# Altium integrated library ICL_komponenty_v1.IntLib: 293 symbols (part 2 of 2)
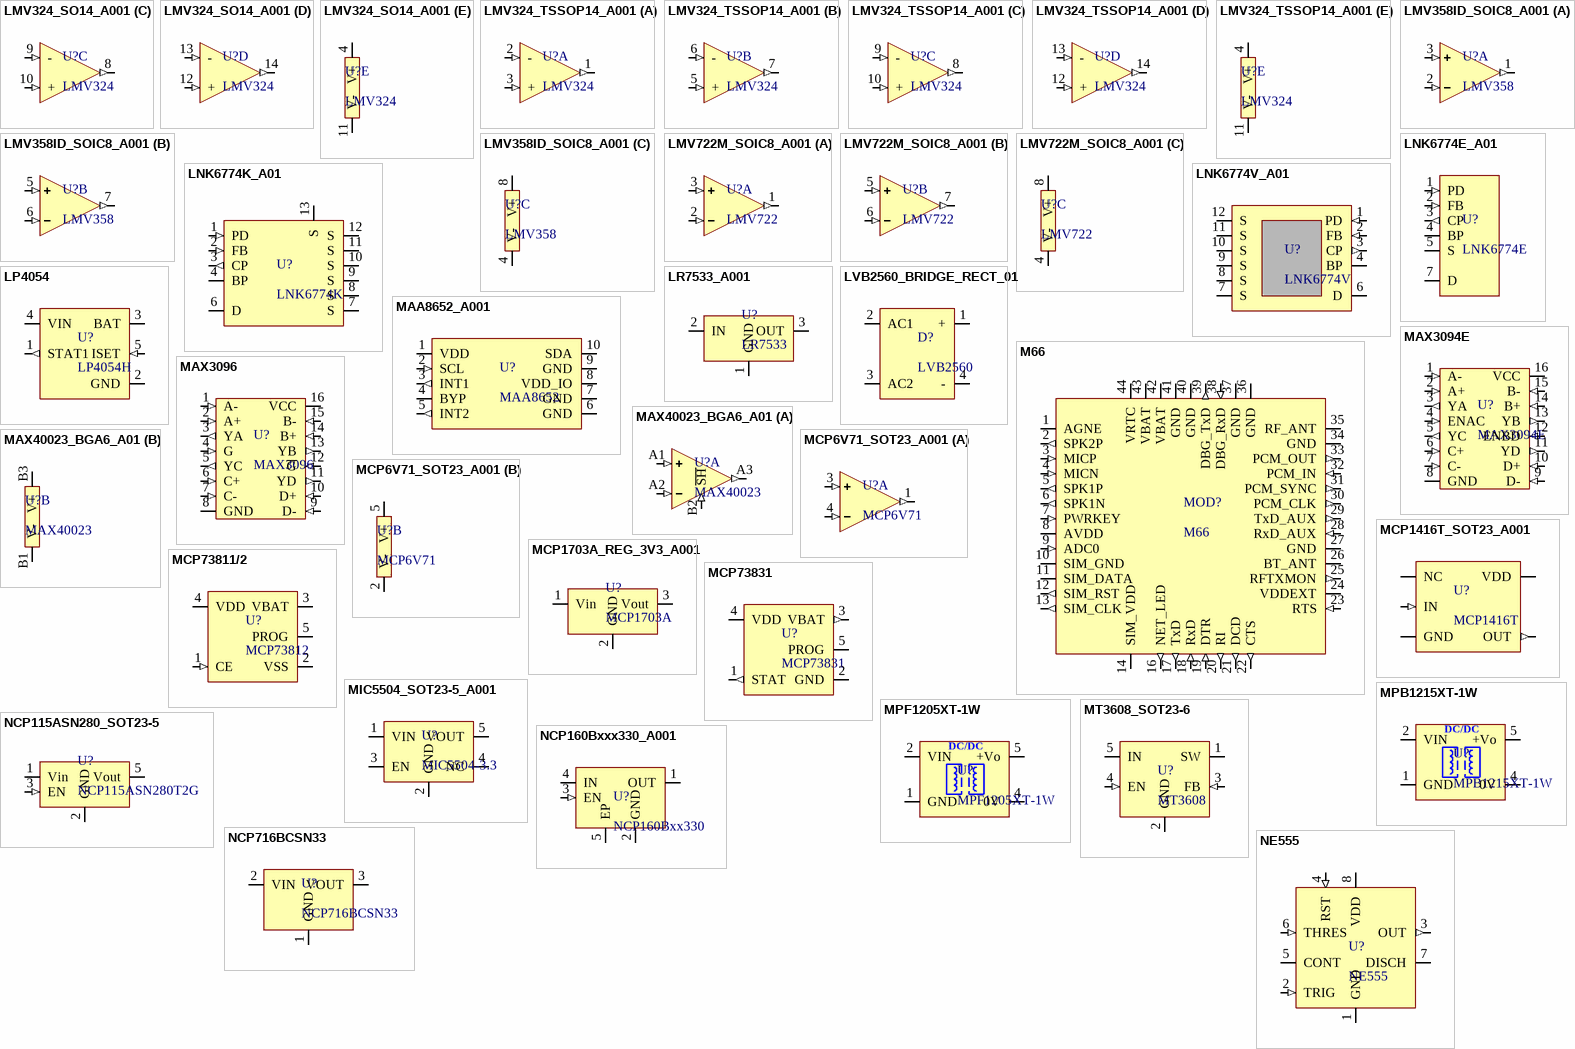
[diagram p12: symbols LMV324_SO14_A001 to NE555]

## LMV324_SO14_A001
designator U?, comment LMV324
4 x OpAmp R/R 1MHz; ICLN: IC_LMV324_SO14_A001
footprint SO-14
part A pins: 1 OUT (out), 2 - (in), 3 + (in)
part B pins: 5 + (in), 6 - (in), 7 OUT (out)
part C pins: 8 OUT (out), 9 - (in), 10 + (in)
part D pins: 12 + (in), 13 - (in), 14 OUT (out)
part E pins: 4 V+ (power), 11 V-

## LMV324_TSSOP14_A001
designator U?, comment LMV324
4 x OpAmp R/R 1MHz; ICLN: IC_LMV324_TSSOP14_A001
footprint TSSOP-14
part A pins: 1 OUT (out), 2 - (in), 3 + (in)
part B pins: 5 + (in), 6 - (in), 7 OUT (out)
part C pins: 8 OUT (out), 9 - (in), 10 + (in)
part D pins: 12 + (in), 13 - (in), 14 OUT (out)
part E pins: 4 V+ (power), 11 V-

## LMV358ID_SOIC8_A001
designator U?, comment LMV358
Low cost, low power, input/output rail-to-rail operational / amplifiers; ICLN: IC_LMV358ID_SOIC8_A001
footprint SO-8
part A pins: 1 1OUT (out), 2 1IN- (in), 3 1IN+ (in)
part B pins: 5 1IN+ (in), 6 1IN- (in), 7 1OUT (out)
part C pins: 4 V-, 8 V+ (power)

## LMV722M_SOIC8_A001
designator U?, comment LMV722
Low cost, low power, input/output rail-to-rail operational / amplifiers; ICLN: IC_LMV722N_SOIC8_A001
footprint SO-8
part A pins: 1 1OUT (out), 2 1IN- (in), 3 1IN+ (in)
part B pins: 5 1IN+ (in), 6 1IN- (in), 7 1OUT (out)
part C pins: 4 V-, 8 V+ (power)

## LNK6774E_A01
designator U?, comment LNK6774E
ICLN: IC_LNK6773E_eSOP_A001
footprint eSIP-7C
pins: 1 PD (in), 2 FB (in), 3 CP (out), 4 BP, 5 S, 7 D

## LNK6774K_A01
designator U?, comment LNK6774K
ICLN: IC_LNK6773K_eSOP_A001
footprint eSOP-12B
pins: 1 PD (in), 2 FB (in), 3 CP (out), 4 BP, 6 D, 7 S, 8 S, 9 S, 10 S, 11 S, 12 S, 13 S

## LNK6774V_A01
designator U?, comment LNK6774V
ICLN: IC_LNK6773V_eDIP_A001
footprint eDIP-12B
pins: 1 PD (in), 2 FB (in), 3 CP (out), 4 BP, 6 D, 7 S, 8 S, 9 S, 10 S, 11 S, 12 S

## LP4054
designator U?, comment LP4054H
Standalone Linear Li-Ion Battery Charger 500mA; ICLN: IC_LP4054H_SOT23-5_A001
footprint SOT-23-5
pins: 1 STAT1 (out), 2 GND, 3 BAT (power), 4 VIN (power), 5 ISET (in)

## LR7533_A001
designator U?, comment LR7533
3V3 LDO low IQ
footprint SOT89-3
pins: 1 GND, 2 IN, 3 OUT

## LVB2560_BRIDGE_RECT_01
designator D?, comment LVB2560
Bridge rect. 25A  600V; ICLN: D_DR_25A_600V_THT_GSIB-5S_A001
footprint GSIB-5S-45 (dridge rectifier 45 degry)
pins: 1 +, 2 AC1, 3 AC2, 4 -

## M66
designator MOD?
Quectel M66; ITSN: MOD_GSM_M66_A001
footprint M66
pins: 1 AGNE (power), 2 SPK2P (out), 3 MICP (in), 4 MICN (in), 5 SPK1P (out), 6 SPK1N (out), 7 PWRKEY (in), 8 AVDD (power), 9 ADC0 (in), 10 SIM_GND (power), 11 SIM_DATA (io), 12 SIM_RST (out), 13 SIM_CLK (out), 14 SIM_VDD (power), 16 NET_LED (out), 17 TxD (out), 18 RxD (in), 19 DTR (in), 20 RI (out), 21 DCD (out), 22 CTS (out), 23 RTS (in), 24 VDDEXT (power), 25 RFTXMON (out), 26 BT_ANT, 27 GND (power), 28 RxD_AUX (in), 29 TxD_AUX (out), 30 PCM_CLK (out), 31 PCM_SYNC (out), 32 PCM_IN (in), 33 PCM_OUT (out), 34 GND (power), 35 RF_ANT, 36 GND (power), 37 GND (power), 38 DBG_RxD (in), 39 DBG_TxD (out), 40 GND (power), 41 GND (power), 42 VBAT (power), 43 VBAT (power), 44 VRTC (power)

## MAA8652_A001
designator U?, comment MAA8652
ITSN: IC_KX003_LGA12_A001
footprint DFN-10_ACC (PQFN, 10-Leads, Body 2,00x2,00mm, Pitch 0,40mm, Thermal Pad 0,50x0,50mm, IPC Medium Density)
pins: 1 VDD (power), 2 SCL (in), 3 INT1 (out), 4 BYP, 5 INT2 (out), 6 GND (power), 7 GND (power), 8 VDD_IO (power), 9 GND (power), 10 SDA (io)

## MAX3094E
designator U?
RS422 3v3 SUPPLY
footprint SO-16 (SOIC, 16-Leads, Body 10,0x4,0mm (max), Pitch 1,27mm, IPC Low Density)
pins: 1 A- (in), 2 A+ (in), 3 YA (out), 4 ENAC (in), 5 YC (out), 6 C+ (in), 7 C- (in), 8 GND (power), 9 D- (in), 10 D+ (in), 11 YD (out), 12 ENBD (in), 13 YB (out), 14 B+ (in), 15 B- (in), 16 VCC (power)

## MAX3096
designator U?
RS422 3V3 SUPPLY; ICLN: IC_MAX3096_SO16_A001
footprint SO-16 (SOIC, 16-Leads, Body 10,0x4,0mm (max), Pitch 1,27mm, IPC Low Density)
pins: 1 A- (in), 2 A+ (in), 3 YA (out), 4 G (in), 5 YC (out), 6 C+ (in), 7 C- (in), 8 GND (power), 9 D- (in), 10 D+ (in), 11 YD (out), 12 ~{G} (in), 13 YB (out), 14 B+ (in), 15 B- (in), 16 VCC (power)

## MAX40023_BGA6_A01
designator U?, comment MAX40023
Low-Noise, Low-Power, Low-Bias-Current Amplifiers; ICLN: IC_MAX40023_BGA6_A01
footprint BGA-6_MAXIM
part A pins: A1 1IN+ (in), A2 1IN- (in), A3 1OUT (out), B2 ~{SH} (in)
part B pins: B1 V-, B3 V+ (power)

## MCP6V71_SOT23_A001
designator U?, comment MCP6V71
2 MHz Zero-Drift Op Amps,  Rail-to-Rail Input/Output; ICLN: IC_MCP6V71_SOT23_A001
footprint SOT-23-5
part A pins: 1 1OUT (out), 3 1IN+ (in), 4 1IN- (in)
part B pins: 2 V-, 5 V+ (power)

## MCP1416T_SOT23_A001
designator U?, comment MCP1416T
High speed power MOSFET driver; ITSN: IC_MCP1416_SOT23_A001
footprint SOT-23-5
pins: 1 NC, 2 VDD (power), 3 IN (in), 4 GND (power), 5 OUT (out)

## MCP1703A_REG_3V3_A001
designator U?, comment MCP1703A
LDO Vdrop<600mV, SOT-223, 500mA, Iq = 2uA; ITSN: IC_SPX3819_SOT23-5_A001
footprint SOT-223
pins: 1 Vin, 2 GND, 3 Vout

## MCP73811/2
designator U?, comment MCP73812
single cell Li-Ion Li-Poly linear baterry charger; ITSN: IC_MCP73812_SOT23-5_A001
footprint SOT-23-5
pins: 1 CE (in), 2 VSS (power), 3 VBAT, 4 VDD (power), 5 PROG

## MCP73831
designator U?
500 mA Li-Ion Battery Charge; ITSN: IC_MCP73831_SOT23-5_A001
footprint SOT-23-5
pins: 1 STAT (out), 2 GND (power), 3 VBAT (out), 4 VDD (power), 5 PROG

## MIC5504_SOT23-5_A001
designator U?, comment MIC5504-3.3
Multi komponent 2.2-3.3 V 100mA Iq<65uA; ITSN: IC_LIN_REG_MULTI_SOT23-5_A001
footprint SOT-23-5
pins: 1 VIN (power), 2 GND (power), 3 EN (power), 4 NC, 5 VOUT (power)

## MPB1215XT-1W
designator U?
Isolated DCDC 12V-15V; ICLN: DCDC_MPB1215XT-1W_A001
footprint MPFxxxxXT-1W (MPF MPB isolated DC-DC converter)
pins: 1 GND (power), 2 VIN (power), 4 0V (power), 5 +Vo (power)
text: DC/DC

## MPF1205XT-1W
designator U?
Isolated DCDC 12V-5V; ICLN: DCDC_MPF1205XT-1W_A001
footprint MPFxxxxXT-1W (MPF MPB isolated DC-DC converter)
pins: 1 GND (power), 2 VIN (power), 4 0V (power), 5 +Vo (power)
text: DC/DC

## MT3608_SOT23-6
designator U?, comment MT3608
Boost MT3608; ICLN: IC_MT3608_SOT23-6_A001
footprint SOT23-6 (Zetex)
pins: 1 SW, 2 GND, 3 FB (in), 4 EN (in), 5 IN

## NCP115ASN280_SOT23-5
designator U?, comment NCP115ASN280T2G
2V8 LDO; ICLN: IC_NCP115ASN280T2G_SOT32-5_A001
footprint SOT-23-5
pins: 1 Vin, 2 GND, 3 EN (in), 5 Vout

## NCP160Bxxx330_A001
designator U?, comment NCP160Bxx330
Low drop low noise LDO 3V3; ICLN: IC_NCP160BFCS330_A001
footprint XDFN4
pins: 1 OUT (power), 2 GND, 3 EN (in), 4 IN (power), 5 EP

## NCP716BCSN33
designator U?
ICLN: IC_NCP716BCSN33_SOT23-5_A001
footprint SOT-23-5
pins: 1 GND (power), 2 VIN (power), 3 VOUT (power)

## NE555
designator U?
ITSN: IC_NE555_SO8_A001
footprint SO-8
pins: 1 GND (power), 2 TRIG (in), 3 OUT (out), 4 RST (in), 5 CONT, 6 THRES (in), 7 DISCH (oc), 8 VDD (power)

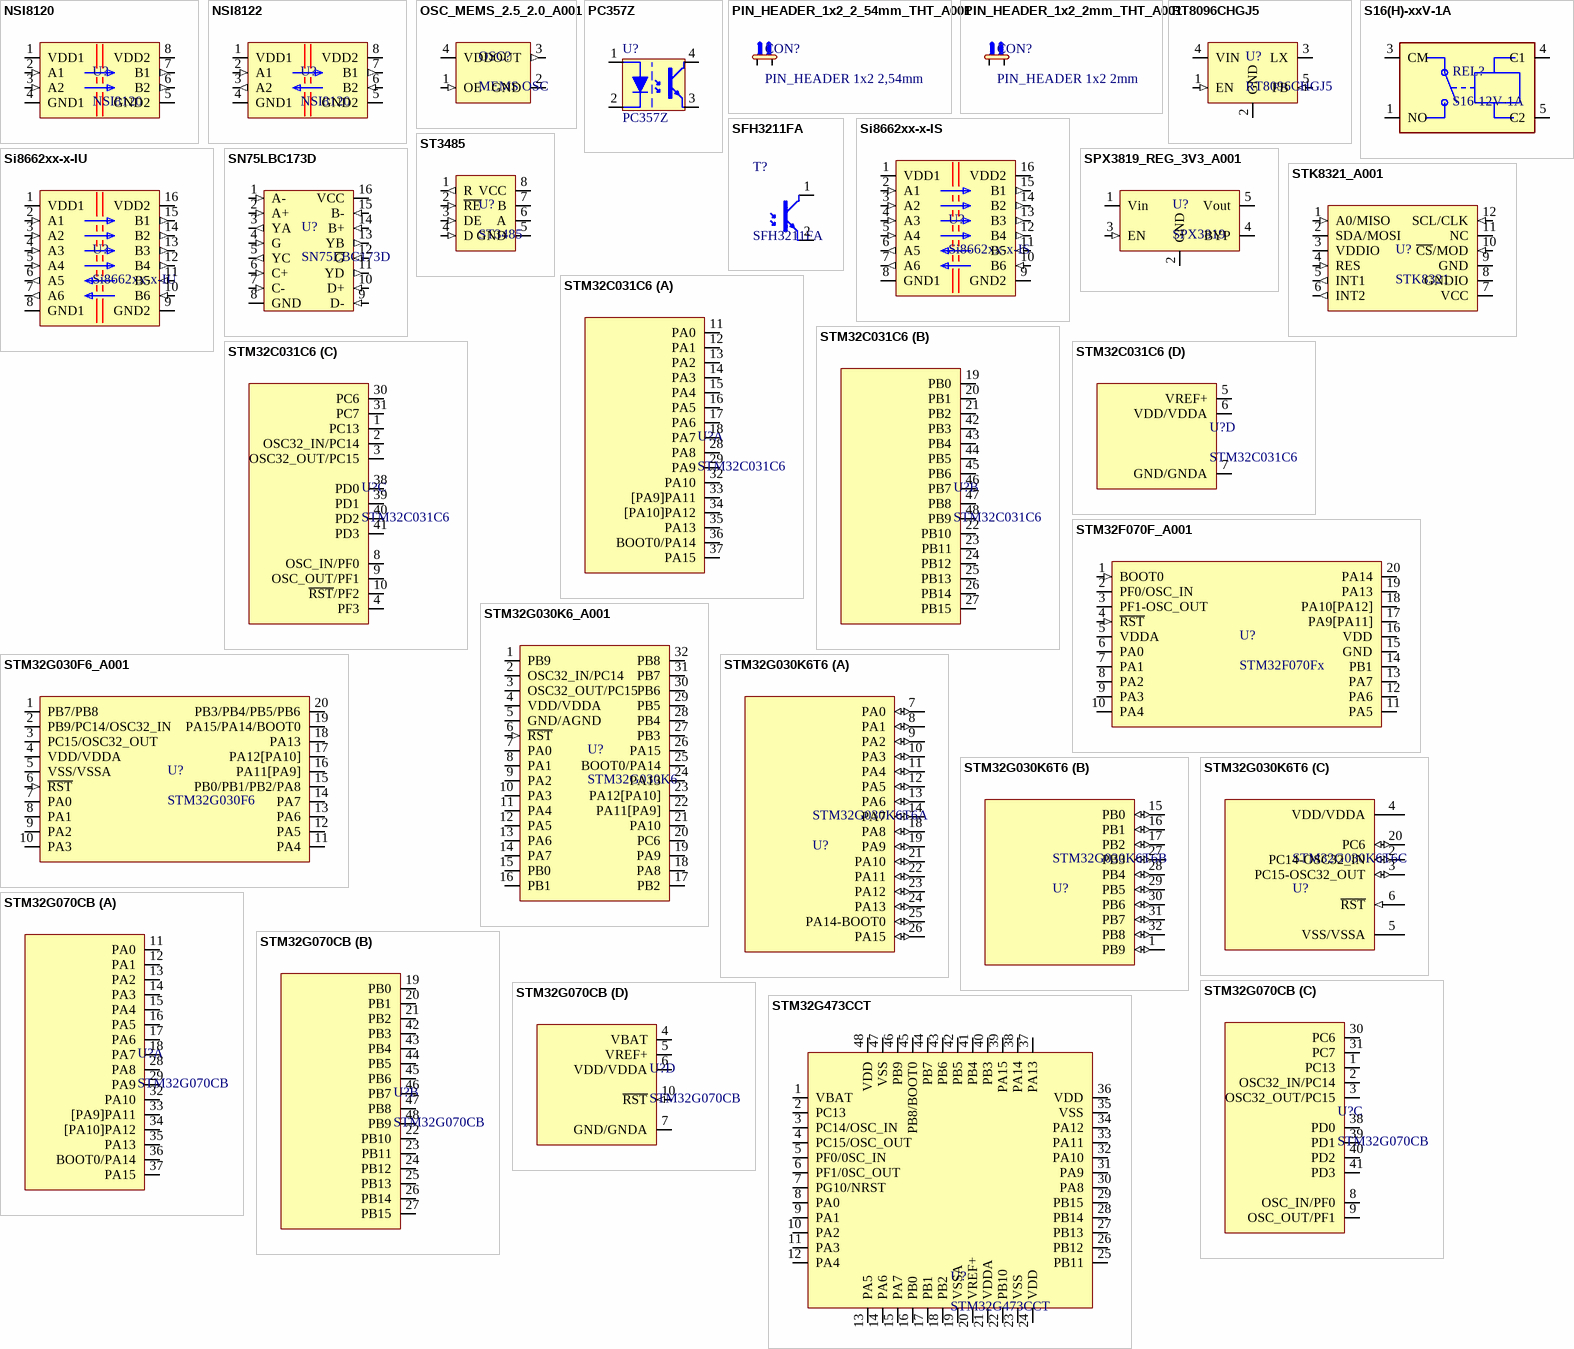
[diagram p8: symbols NSI8120 to STM32G473CCT]

## NSI8120
designator U?
2 channel iso; ICLN: IC_NSI8120_SO-8_A001
footprint SO-8
pins: 1 VDD1 (power), 2 A1 (in), 3 A2 (in), 4 GND1 (power), 5 GND2 (power), 6 B2 (out), 7 B1 (out), 8 VDD2 (power)

## NSI8122
designator U?, comment NSI8120
2 channel iso; ICLN: IC_NSI8122_SO-8_A001
footprint SO-8
pins: 1 VDD1 (power), 2 A1 (in), 3 A2 (out), 4 GND1 (power), 5 GND2 (power), 6 B2 (in), 7 B1 (out), 8 VDD2 (power)

## OSC_MEMS_2.5_2.0_A001
designator OSC?, comment MEMS OSC
ITSN: MEMS_OSC_8MHZ_A001
footprint MEMS_OSC_2.5_3-2_2.5_v1 (mems oscilator 2.5x2 or 3.2x2.5)
pins: 1 OE (in), 2 GND (power), 3 OUT (out), 4 VDD (power)

## PC357Z
designator U?
ITSN: OCT_PC357_SMD_A001
footprint Mini-Flat_4
pins: 1 A, 2 K, 3 E, 4 C

## PIN_HEADER_1x2_2_54mm_THT_A001
designator CON?, comment PIN_HEADER 1x2 2,54mm
footprint PIN_HEADER_1x2_2.54_THT_A001
pins: 1, 2

## PIN_HEADER_1x2_2mm_THT_A001
designator CON?, comment PIN_HEADER 1x2 2mm
footprint PIN_HEADER_1x2_2_THT_A001
pins: 1, 2

## RT8096CHGJ5
designator U?
DCDC step down 6V; ICLN: IC_RT8096CHGJ5_SOT23-5_A001
footprint SOT-23-5
pins: 1 EN (in), 2 GND, 3 LX, 4 VIN, 5 FB (in)

## S16(H)-xxV-1A
designator REL?, comment S16-12V-1A
Automotive relay S16 70A(150A); ICLN: REL_001A
footprint S16-xx-1A_RELAY (Automotive Relay 80A NO)
pins: 1 NO, 3 CM, 4 C1, 5 C2

## SFH3211FA
designator T?
phototransistor PLCC reverse mounting; ITSN: nn
footprint PLCC_RG (reverse mounting PLCC)
pins: 1 C, 2 E

## Si8662xx-x-IS
designator U?
ITSN: IC_SI8662_SOIC16_A001
footprint SOIC-16 (SOIC, 16-Leads, Body 10,0x4,0mm (max), Pitch 1,27mm, IPC Low Density)
pins: 1 VDD1 (power), 2 A1 (in), 3 A2 (in), 4 A3 (in), 5 A4 (in), 6 A5 (out), 7 A6 (out), 8 GND1 (power), 9 GND2 (power), 10 B6 (in), 11 B5 (in), 12 B4 (out), 13 B3 (out), 14 B2 (out), 15 B1 (out), 16 VDD2 (power)

## Si8662xx-x-IU
designator U?
ITSN: IC_SI8662_SO16_A001
footprint SO-16-W
pins: 1 VDD1 (power), 2 A1 (in), 3 A2 (in), 4 A3 (in), 5 A4 (in), 6 A5 (out), 7 A6 (out), 8 GND1 (power), 9 GND2 (power), 10 B6 (in), 11 B5 (in), 12 B4 (out), 13 B3 (out), 14 B2 (out), 15 B1 (out), 16 VDD2 (power)

## SN75LBC173D
designator U?
RS422 5V SUPPLY; ICLN: IC_SN75LBC173D_SO16_A001
footprint SO-16 (SOIC, 16-Leads, Body 10,0x4,0mm (max), Pitch 1,27mm, IPC Low Density)
pins: 1 A- (in), 2 A+ (in), 3 YA (out), 4 G (in), 5 YC (out), 6 C+ (in), 7 C- (in), 8 GND (power), 9 D- (in), 10 D+ (in), 11 YD (out), 12 ~{G} (in), 13 YB (out), 14 B+ (in), 15 B- (in), 16 VCC (power)

## SPX3819_REG_3V3_A001
designator U?, comment SPX3819
LDO Vdrop<600mV, SOT23-5, 500mA; ITSN: IC_SPX3819_SOT23-5_A001
footprint SOT-23-5
pins: 1 Vin, 2 GND, 3 EN (in), 4 BYP, 5 Vout

## ST3485
designator U?
ST3485 3V3; ICLN: IC_ST3485_SO-8_A001
footprint SO-8
pins: 1 R (out), 2 ~{RE} (in), 3 DE (in), 4 D (in), 5 GND (power), 6 A, 7 B, 8 VCC (power)

## STK8321_A001
designator U?, comment STK8321
ICLN: na
footprint LGA-12 (LGA, 12-Leads, Body 2,00x2,00mmx0,70mm, Pitch 0,50mm)
pins: 1 A0/MISO (in), 2 SDA/MOSI (io), 3 VDDIO (power), 4 RES (in), 5 INT1 (out), 6 INT2 (out), 7 VCC (power), 8 GNDIO (power), 9 GND (power), 10 ~{CS}/MOD (in), 11 NC, 12 SCL/CLK (in)

## STM32C031C6
designator U?
cortex M0+ 32k//12k; ICLN: *
footprint LQFP48
part A pins: 11 PA0 (io), 12 PA1 (io), 13 PA2 (io), 14 PA3 (io), 15 PA4 (io), 16 PA5 (io), 17 PA6 (io), 18 PA7 (io), 28 PA8 (io), 29 PA9 (io), 32 PA10 (io), 33 [PA9]PA11 (io), 34 [PA10]PA12 (io), 35 PA13 (io), 36 BOOT0/PA14 (io), 37 PA15 (io)
part B pins: 19 PB0 (io), 20 PB1 (io), 21 PB2 (io), 22 PB10 (io), 23 PB11 (io), 24 PB12 (io), 25 PB13 (io), 26 PB14 (io), 27 PB15 (io), 42 PB3 (io), 43 PB4 (io), 44 PB5 (io), 45 PB6 (io), 46 PB7 (io), 47 PB8 (io), 48 PB9 (io)
part C pins: 1 PC13 (io), 2 OSC32_IN/PC14 (io), 3 OSC32_OUT/PC15 (io), 4 PF3 (io), 8 OSC_IN/PF0 (io), 9 OSC_OUT/PF1 (io), 10 ~{RST}/PF2 (io), 30 PC6 (io), 31 PC7 (io), 38 PD0 (io), 39 PD1 (io), 40 PD2 (io), 41 PD3 (io)
part D pins: 5 VREF+ (power), 6 VDD/VDDA (power), 7 GND/GNDA (power)

## STM32F070F_A001
designator U?, comment STM32F070Fx
STM32F070Fx TSSOP20 32k/6k; ITSN: *
footprint TSSOP-20
pins: 1 BOOT0 (in), 2 PF0/OSC_IN (io), 3 PF1-OSC_OUT (io), 4 ~{RST} (in), 5 VDDA (power), 6 PA0 (io), 7 PA1 (io), 8 PA2 (io), 9 PA3 (io), 10 PA4 (io), 11 PA5 (io), 12 PA6 (io), 13 PA7 (io), 14 PB1 (io), 15 GND (power), 16 VDD (power), 17 PA9[PA11] (io), 18 PA10[PA12] (io), 19 PA13 (io), 20 PA14 (io)

## STM32G030F6_A001
designator U?, comment STM32G030F6
STN32G030F6 TSSOP20 32k/8k; ICLN: IC_STM32G030F6_TSSOP20_A001
footprint TSSOP-20
pins: 1 PB7/PB8 (io), 2 PB9/PC14/OSC32_IN (io), 3 PC15/OSC32_OUT (io), 4 VDD/VDDA (power), 5 VSS/VSSA (power), 6 ~{RST} (in), 7 PA0 (io), 8 PA1 (io), 9 PA2 (io), 10 PA3 (io), 11 PA4 (io), 12 PA5 (io), 13 PA6 (io), 14 PA7 (io), 15 PB0/PB1/PB2/PA8 (io), 16 PA11[PA9] (io), 17 PA12[PA10] (io), 18 PA13 (io), 19 PA15/PA14/BOOT0 (io), 20 PB3/PB4/PB5/PB6 (io)

## STM32G030K6_A001
designator U?, comment STM32G030K6
STM32G030K6 32k/8k 32pin; ITSN: IC_STM32G030K6_LQFP32_A001
footprint LQFP32_A002 (TQFP, 32-Leads, Body 7,00x7,00mm, Pitch 0,80mm, IPC Low Density)
pins: 1 PB9 (io), 2 OSC32_IN/PC14 (io), 3 OSC32_OUT/PC15 (io), 4 VDD/VDDA (power), 5 GND/AGND (power), 6 ~{RST} (in), 7 PA0 (io), 8 PA1 (io), 9 PA2 (io), 10 PA3 (io), 11 PA4 (io), 12 PA5 (io), 13 PA6 (io), 14 PA7 (io), 15 PB0 (io), 16 PB1 (io), 17 PB2 (io), 18 PA8 (io), 19 PA9 (io), 20 PC6 (io), 21 PA10 (io), 22 PA11[PA9] (io), 23 PA12[PA10] (io), 24 PA13 (io), 25 BOOT0/PA14 (io), 26 PA15 (io), 27 PB3 (io), 28 PB4 (io), 29 PB5 (io), 30 PB6 (io), 31 PB7 (io), 32 PB8 (io)

## STM32G030K6T6
designator STM32G030K6T6, comment U?
Flash: 32kB; 64MHz; SRAM: 8kB; LQFP32; 2÷3,6VDC; ITSN: IC_STM32G030K6_LQFP32_A001
footprint LQFP32 (TQFP, 32-Leads, Body 7,00x7,00mm, Pitch 0,80mm, IPC Low Density)
part A pins: 7 PA0 (io), 8 PA1 (io), 9 PA2 (io), 10 PA3 (io), 11 PA4 (io), 12 PA5 (io), 13 PA6 (io), 14 PA7 (io), 18 PA8 (io), 19 PA9 (io), 21 PA10 (io), 22 PA11 (io), 23 PA12 (io), 24 PA13 (io), 25 PA14-BOOT0 (io), 26 PA15 (io)
part B pins: 1 PB9 (io), 15 PB0 (io), 16 PB1 (io), 17 PB2 (io), 27 PB3 (io), 28 PB4 (io), 29 PB5 (io), 30 PB6 (io), 31 PB7 (io), 32 PB8 (io)
part C pins: 2 PC14-OSC32_IN (io), 3 PC15-OSC32_OUT (io), 4 VDD/VDDA (power), 5 VSS/VSSA (power), 6 ~{RST} (in), 20 PC6 (io)

## STM32G070CB
designator U?
ITSN: *
footprint LQFP48
part A pins: 11 PA0 (io), 12 PA1 (io), 13 PA2 (io), 14 PA3 (io), 15 PA4 (io), 16 PA5 (io), 17 PA6 (io), 18 PA7 (io), 28 PA8 (io), 29 PA9 (io), 32 PA10 (io), 33 [PA9]PA11 (io), 34 [PA10]PA12 (io), 35 PA13 (io), 36 BOOT0/PA14 (io), 37 PA15 (io)
part B pins: 19 PB0 (io), 20 PB1 (io), 21 PB2 (io), 22 PB10 (io), 23 PB11 (io), 24 PB12 (io), 25 PB13 (io), 26 PB14 (io), 27 PB15 (io), 42 PB3 (io), 43 PB4 (io), 44 PB5 (io), 45 PB6 (io), 46 PB7 (io), 47 PB8 (io), 48 PB9 (io)
part C pins: 1 PC13 (io), 2 OSC32_IN/PC14 (io), 3 OSC32_OUT/PC15 (io), 8 OSC_IN/PF0 (io), 9 OSC_OUT/PF1 (io), 30 PC6 (io), 31 PC7 (io), 38 PD0 (io), 39 PD1 (io), 40 PD2 (io), 41 PD3 (io)
part D pins: 4 VBAT (power), 5 VREF+ (power), 6 VDD/VDDA (power), 7 GND/GNDA (power), 10 ~{RST} (in)

## STM32G473CCT
designator U?
footprint LQFP48
pins: 1 VBAT (power), 2 PC13 (io), 3 PC14/OSC_IN (io), 4 PC15/OSC_OUT (io), 5 PF0/0SC_IN (io), 6 PF1/0SC_OUT (io), 7 PG10/NRST (io), 8 PA0 (io), 9 PA1 (io), 10 PA2 (io), 11 PA3 (io), 12 PA4 (io), 13 PA5 (io), 14 PA6 (io), 15 PA7 (io), 16 PB0 (io), 17 PB1 (io), 18 PB2 (io), 19 VSSA (power), 20 VREF+ (power), 21 VDDA (power), 22 PB10 (io), 23 VSS (power), 24 VDD (power), 25 PB11 (io), 26 PB12 (io), 27 PB13 (io), 28 PB14 (io), 29 PB15 (io), 30 PA8 (io), 31 PA9 (io), 32 PA10 (io), 33 PA11 (io), 34 PA12 (io), 35 VSS (power), 36 VDD (power), 37 PA13 (io), 38 PA14 (io), 39 PA15 (io), 40 PB3 (io), 41 PB4 (io), 42 PB5 (io), 43 PB6 (io), 44 PB7 (io), 45 PB8/BOOT0 (io), 46 PB9 (io), 47 VSS (power), 48 VDD (power)
